# Altium footprint library UWRT Footprint Library.PcbLib: 258 footprints (part 4 of 17)
Each footprint in its own frame and in the unit in brackets; x right, y up, seen from the top. Pads: shape width x height; smd on the part's side, far side on the other; paste and mask are expansions set on the pad; w line width, h text height; cw(c..) or ccw(c..) is an arc to the next point about the centre after c.
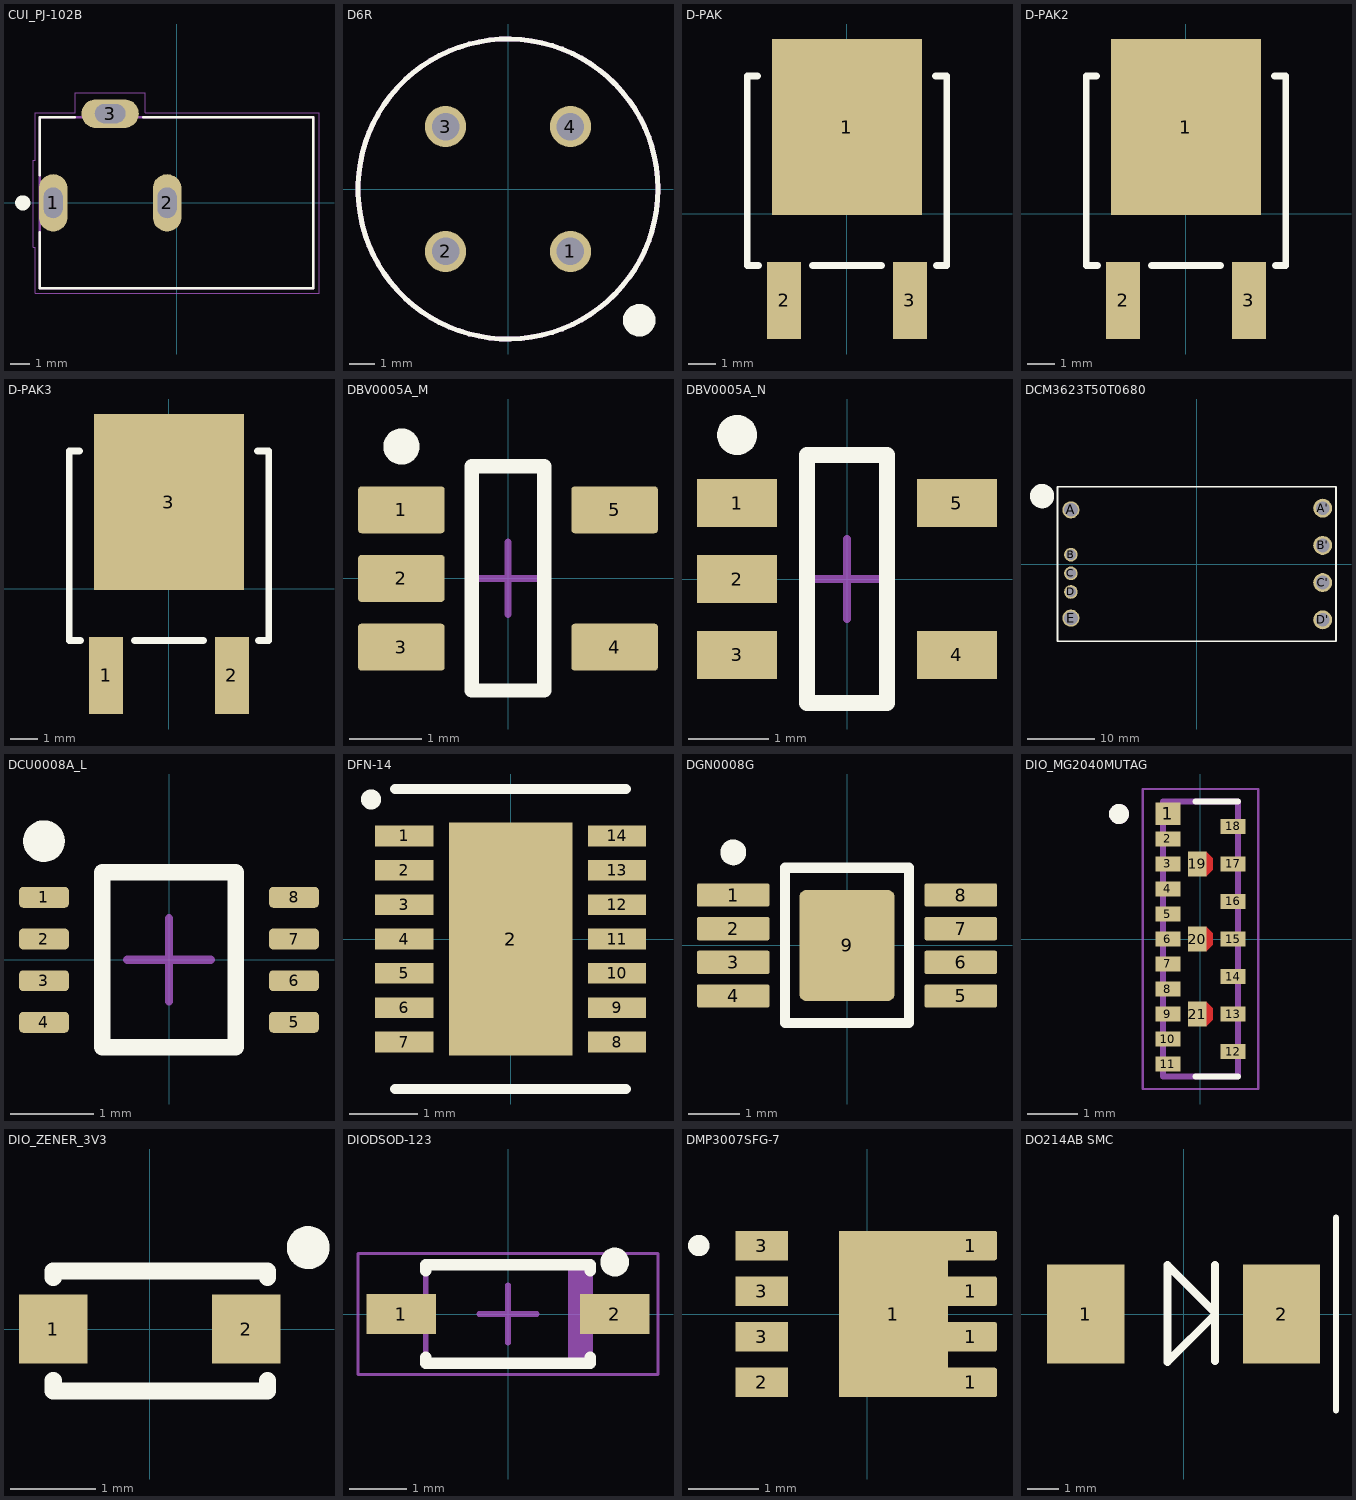
[diagram p3: the footprints below, top view; thin cyan lines are the x and y axes]

## CUI_PJ-102B [mm]
pads (3):
  oval 1.508x3.016 hole 1 slot 1.6 at 90 deg: 1(-6.5,0) 2(-0.5,0)
  oval 3.016x1.508 hole 1 slot 1.6 at 0 deg: 3(-3.5,4.7)
Top Overlay:
  circle w0.4: c-8.1,0 r0.2
  lines w0.127: -7.2,-1.55 -7.2,-4.5 7.2,-4.5 7.2,4.5 -1.75,4.5 ; -7.2,1.45 -7.2,4.5 -5.35,4.5
Mechanical 13:
  lines w0.127: -7.2,-4.5 7.2,-4.5 7.2,4.5 -7.2,4.5 -7.2,-4.5
Mechanical 15:
  lines w0.05: -7.55,-2.35 -7.55,2.25 -7.45,2.25 -7.45,4.75 -5.35,4.75 -5.35,5.8 -1.65,5.8 -1.65,4.75 7.5,4.75 7.5,-4.75 -7.45,-4.75 -7.45,-2.35 -7.55,-2.35
3D body "CUI_DEVICES_PJ-102B.step": height 11.5, standoff -3, extent -7.2,-4.5 7.2,4.9

## D6R [mm]
pads (4):
  round 1.64 hole 1.1: 1(2.5,-2.5) 2(-2.5,-2.5) 3(-2.5,2.5) 4(2.5,2.5)
Top Overlay:
  circle w0.2: c0,0 r6
  circle w0.7: c5.25,-5.25 r0.3
Mechanical 13:
  circle w0.2: c0,0 r6
3D body "User Library-D6R.STEP": height 12.8, standoff -4.5, extent -5.4,-6 6,6

## D-PAK [mm] "TO-252AA"
pads (3):
  rect 5.55x6.5 smd: 1(0,3.2)
  rect 1.25x2.85 smd: 2(-2.325,-3.2) 3(2.325,-3.2)
Top Overlay:
  lines w0.254: -3.302,5.08 -3.683,5.08 -3.683,-1.905 -3.27,-1.905 ; -1.27,-1.905 1.27,-1.905 ; 3.27,5.08 3.683,5.08 3.683,-1.905 3.302,-1.905
3D body "FERD20H100SB-TR--3DModel-STEP-56544.STEP": height 2.64, standoff 0.01, extent -3.27,-4.08 3.27,5.795

## D-PAK2 [mm] "TO-252AA"
pads (3):
  rect 5.55x6.5 smd: 1(0,3.2)
  rect 1.25x2.85 smd: 2(-2.325,-3.2) 3(2.325,-3.2)
Top Overlay:
  lines w0.254: -3.302,5.08 -3.683,5.08 -3.683,-1.905 -3.27,-1.905 ; -1.27,-1.905 1.27,-1.905 ; 3.27,5.08 3.683,5.08 3.683,-1.905 3.302,-1.905
3D body "FERD20H100SB-TR--3DModel-STEP-56544.STEP": height 2.64, standoff 0.01, extent -3.27,-4.08 3.27,5.795

## D-PAK3 [mm]
pads (3):
  rect 1.25x2.85 smd: 1(-2.325,-3.2) 2(2.325,-3.2)
  rect 5.55x6.5 smd: 3(0,3.2)
Top Overlay:
  lines w0.254: -3.302,5.08 -3.683,5.08 -3.683,-1.905 -3.27,-1.905 ; -1.27,-1.905 1.27,-1.905 ; 3.27,5.08 3.683,5.08 3.683,-1.905 3.302,-1.905
3D body "FERD20H100SB-TR--3DModel-STEP-56544.STEP": height 2.64, standoff 0.01, extent -3.27,-4.08 3.27,5.795

## DBV0005A_M [mm] "SOT23, 5-Leads, Body 3.05x1.75mm, Pitch 0.95mm, IPC Low Density"
height 1.45
pads (5):
  rrect15% 1.2x0.65 smd: 1(-1.475,0.95) 2(-1.475,0) 3(-1.475,-0.95) 4(1.475,-0.95) 5(1.475,0.95)
Top Overlay:
  circle w0.25: c-1.475,1.825 r0.125
  lines w0.2: -0.5,-1.55 0.5,-1.55 0.5,1.55 -0.5,1.55 -0.5,-1.55
Mechanical 15:
  lines w0.1: -0.5,0 0.5,0 ; 0,-0.5 0,0.5
3D body "DBV0005AaksMF05A.stp": height 1.08, standoff -0.01, extent -1.422,-1.461 1.422,1.46

## DBV0005A_N [mm] "SOT23, 5-Leads, Body 3.05x1.75mm, Pitch 0.95mm, IPC Medium Density"
height 1.45
pads (5):
  rect 1x0.6 smd: 1(-1.375,0.95) 2(-1.375,0) 3(-1.375,-0.95) 4(1.375,-0.95) 5(1.375,0.95)
Top Overlay:
  circle w0.25: c-1.375,1.8 r0.125
  lines w0.2: -0.5,-1.55 -0.5,1.55 0.5,1.55 0.5,-1.55 -0.5,-1.55
Mechanical 15:
  lines w0.1: -0.5,0 0.5,0 ; 0,-0.5 0,0.5
3D body "DBV0005AaksMF05A.stp": height 1.08, standoff -0.01, extent -1.422,-1.461 1.422,1.46

## DCM3623T50T0680 [mm] "DC to DC Converter"
height 7.21
pads (9):
  round 2.53 hole 2.03: A(-18.6,8) E(-18.6,-8)
  round 2.79 hole 2.03: A'(18.6,8.25) B'(18.6,2.75) C'(18.6,-2.75) D'(18.6,-8.25)
  round 2.02 hole 1.52: B(-18.6,1.38) C(-18.6,-1.38) D(-18.6,-4.13)
Top Overlay:
  circle w1.8: c-22.86,10.033 r0.898
  lines w0.254: -20.574,-11.4 20.574,-11.4 20.574,11.4 -20.574,11.4 -20.574,-11.4
3D body "3623_dcm_thruhole_no_board.STEP": height 7.28, standoff -4.15, extent -19.541,-11.395 19.176,11.405

## DCU0008A_L [mm] "SOP, 8-Leads, Body 2.4x2.1mm, Pitch 0.5mm, IPC High Density"
height 0.9
pads (8):
  rrect40% 0.6x0.25 smd: 1(-1.5,0.75) 2(-1.5,0.25) 3(-1.5,-0.25) 4(-1.5,-0.75) 5(1.5,-0.75) 6(1.5,-0.25) 7(1.5,0.25) 8(1.5,0.75)
Top Overlay:
  circle w0.25: c-1.5,1.425 r0.125
  lines w0.2: -0.8,-1.05 -0.8,1.05 0.8,1.05 0.8,-1.05 -0.8,-1.05
Mechanical 15:
  lines w0.1: -0.5,0 0.5,0 ; 0,-0.5 0,0.5
3D body "DCU0008A.stp": height 0.9, standoff 0, extent -1.561,-1 1.561,1

## DFN-14 [mm]
pads (15):
  rect 0.85x0.3 smd: 1(-1.55,1.5) 2(-1.55,1) 3(-1.55,0.5) 4(-1.55,0) 5(-1.55,-0.5) 6(-1.55,-1) 7(-1.55,-1.5) 8(1.55,-1.5) 9(1.55,-1) 10(1.55,-0.5) 11(1.55,0) 12(1.55,0.5) 13(1.55,1) 14(1.55,1.5)
  rect 1.8x3.4 smd: 2(0,0)
Top Overlay:
  circle w0.254: c-2.032,2.032 r0.018
  lines w0.152: -1.676,-2.184 1.676,-2.184 ; -1.676,2.184 1.676,2.184
Top Paste:
  region: -0.8,-0.1 -0.8,-1.6 0.8,-1.6 0.8,-0.1
  region: -0.8,1.6 -0.8,0.1 0.8,0.1 0.8,1.6
3D body "User Library-My-DFN-14-4x3-0_5.STEP": height 0.8, standoff 0, extent -1.56,-2.05 1.56,2.05

## DGN0008G [mm] "8-TSSOP, 8-MSOP (0.118\", 3.00mm Width) Exposed Pad"
height 1.1
pads (9):
  rrect15% 1.4x0.45 smd: 1(-2.2,0.975) 2(-2.2,0.325) 3(-2.2,-0.325) 4(-2.2,-0.975) 5(2.2,-0.975) 6(2.2,-0.325) 7(2.2,0.325) 8(2.2,0.975)
  rrect15% 1.846x2.15 smd: 9(0,0)
Top Overlay:
  circle w0.25: c-2.2,1.8 r0.125
  lines w0.2: -1.2,-1.5 1.2,-1.5 1.2,1.5 -1.2,1.5 -1.2,-1.5
Mechanical 15:
  lines w0.1: -0.5,0 0.5,0 ; 0,-0.5 0,0.5
3D body "TPS1H200AQDGNRQ1.STEP": height 1.1, standoff 0, extent -2.45,-1.5 2.45,1.5

## DIO_MG2040MUTAG [mm]
pads (21):
  rect 0.5x0.45 smd: 1(-0.65,2.5)
  rect 0.5x0.3 smd: 2(-0.65,2) 3(-0.65,1.5) 4(-0.65,1) 5(-0.65,0.5) 6(-0.65,0) 7(-0.65,-0.5) 8(-0.65,-1) 9(-0.65,-1.5) 10(-0.65,-2) 11(-0.65,-2.5) 12(0.65,-2.25) 13(0.65,-1.5) 14(0.65,-0.75) 15(0.65,0) 16(0.65,0.75) 17(0.65,1.5) 18(0.65,2.25)
  rect 0.37x0.5 smd mask+0: 19(-0.065,1.5) 20(-0.065,0) 21(-0.065,-1.5)
Top Layer:
  region: 0.25,-1.38 0.25,-1.62 0.12,-1.75 0.12,-1.25
  region: 0.25,0.12 0.25,-0.12 0.12,-0.25 0.12,0.25
  region: 0.25,1.62 0.25,1.38 0.12,1.25 0.12,1.75
Top Overlay:
  circle w0.2: c-1.63,2.5 r0.1
  lines w0.127: -0.1,-2.75 0.75,-2.75 ; -0.1,2.75 0.75,2.75
Top Paste:
  region: 0.25,-1.38 0.25,-1.62 0.12,-1.75 0.12,-1.25
  region: 0.25,1.62 0.25,1.38 0.12,1.25 0.12,1.75
  region: 0.25,0.12 0.25,-0.12 0.12,-0.25 0.12,0.25
Top Solder:
  region: 0.35,1.62 0.35,1.38 0.12,1.15 -0.35,1.15 -0.35,1.85 0.12,1.85
  region: 0.35,-1.38 0.35,-1.62 0.12,-1.85 -0.35,-1.85 -0.35,-1.15 0.12,-1.15
  region: 0.35,0.12 0.35,-0.12 0.12,-0.35 -0.35,-0.35 -0.35,0.35 0.12,0.35
Mechanical 13:
  circle w0.2: c-1.63,2.5 r0.1
  lines w0.127: -0.75,-2.75 0.75,-2.75 0.75,2.75 -0.75,2.75 -0.75,-2.75
Mechanical 15:
  lines w0.05: -1.15,-3 -1.15,3 1.15,3 1.15,-3 -1.15,-3
3D body "MG2040MUTAG--3DModel-STEP-56544.STEP": height 0.55, standoff 0, extent -0.71,-2.75 0.79,2.75

## DIO_ZENER_3V3 [mm] "DIODE ZENER 3.3V 200MW SOD323F"
pads (2):
  rect 0.8x0.8 smd: 1(-1.125,0) 2(1.125,0)
Top Overlay:
  circle w0.25: c1.85,0.95 r0.125
  lines w0.2: -1.125,-0.6 -1.125,-0.725 1.375,-0.725 1.375,-0.6 ; -1.125,0.6 -1.125,0.675 1.375,0.675 1.375,0.6
3D body "1N914BWS--3DModel-STEP-56544.STEP": height 0.91, standoff 0.01, extent -1.125,-0.625 1.375,0.625

## DIODSOD-123 [mm] "SOD-123, 2-Leads, Body 2.85x1.7mm (max), Pitch 3.7mm"
height 1.45
pads (2):
  rect 1.2x0.7 smd: 1(-1.85,0) 2(1.85,0)
Top Overlay:
  circle w0.25: c1.85,0.9 r0.125
  lines w0.2: -1.425,-0.75 -1.425,-0.85 1.425,-0.85 1.425,-0.75 ; -1.425,0.75 -1.425,0.85 1.425,0.85 1.425,0.75
Mechanical 13:
  rectangle: 1.042,-0.85 1.425,0.85
  lines w0.1: -1.425,-0.85 -1.425,0.85 1.425,0.85 1.425,-0.85 -1.425,-0.85
Mechanical 15:
  lines w0.05: -2.6,-1.05 -2.6,1.05 2.6,1.05 2.6,-1.05 -2.6,-1.05
  lines w0.1: -0.5,0 0.5,0 ; 0,-0.5 0,0.5
3D body: height 1.45, standoff 0, extent -1.425,-0.85 1.425,0.85

## DMP3007SFG-7 [mm]
pads (9):
  rect 1.55x2.37 smd: 1(0.375,0)
  rrect15% 0.75x0.42 smd: 1(1.475,-0.975) 1(1.475,-0.325) 1(1.475,0.325) 1(1.475,0.975)
  rect 0.75x0.42 smd: 2(-1.5,-0.975) 3(-1.5,-0.325) 3(-1.5,0.325) 3(-1.5,0.975)
Top Overlay:
  circle w0.254: c-2.4,0.975 r0.025

## DO214AB SMC [mm] "Molded Diode, 2-Leads, Body 6.85x5.90mm, IPC Medium Density"
height 2.62
pads (2):
  rect 2.45x3.15 smd: 1(-3.1,0) 2(3.1,0)
Top Overlay:
  lines w0.2: 4.826,-3.048 4.826,3.048
  lines w0.254: -0.516,1.524 -0.516,-1.524 1,-0.008 ; -0.516,1.548 1,0.032 ; 1,-1.492 1,1.556
3D body "SMC.STEP": height 2.6, standoff 0, extent -3.97,-2.952 3.97,2.952